# Altium footprint library TO Package-Transistor Outline.PcbLib: 31 footprints (part 1 of 2)
Each footprint in its own frame and in the unit in brackets; x right, y up, seen from the top. Pads: shape width x height; smd on the part's side, far side on the other; paste and mask are expansions set on the pad; w line width, h text height; cw(c..) or ccw(c..) is an arc to the next point about the centre after c.
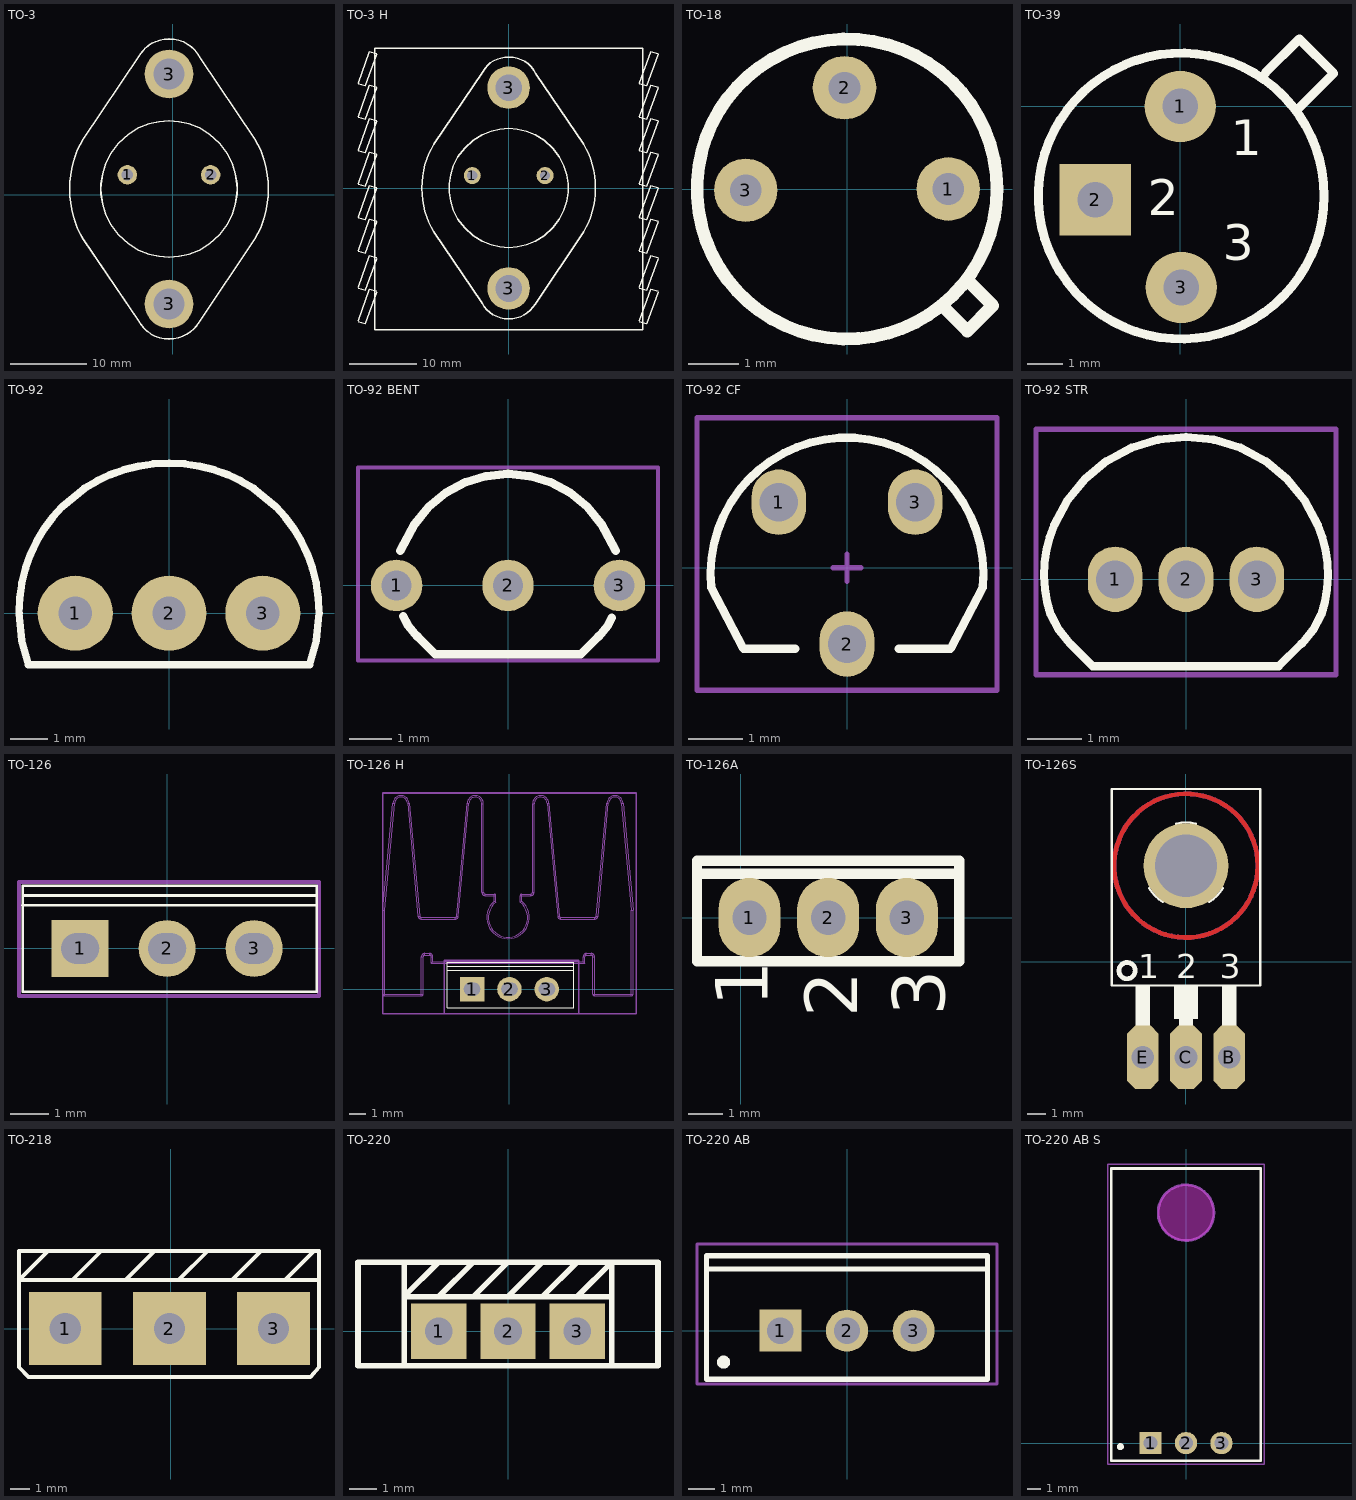
[diagram p0: the footprints below, top view; thin cyan lines are the x and y axes]

## TO-3 [mil]
height 10
pads (4):
  round 100 hole 60: 1(-234,103) 2(194,103)
  round 250 hole 157.4: 3(-20,-560) 3(-20,620)
Top Overlay:
  lines w8: -530,30 -528.8,-5.7 -525.4,-40.5 -519.7,-74.6 -511.9,-107.6 -501.9,-139.6 -489.9,-170.4 -475.9,-199.9 -460,-228 -175,-647 -162.8,-667.1 -148.1,-685.2 -131.1,-701 -112.1,-714.5 -91.3,-725.3 -68.8,-733.3 -45,-738.3 -20,-740 4.6,-738.4 28.1,-733.7 50.3,-726.2 71,-716 90,-703.4 107.1,-688.5 122.2,-671.7 135,-653 420,-227 435.9,-199.2 449.9,-170 461.9,-139.4 471.9,-107.5 479.7,-74.5 485.4,-40.5 488.8,-5.7 490,30 488.8,65.7 485.4,100.5 479.7,134.5 471.9,167.5 461.9,199.4 449.9,230 435.9,259.2 420,287 140,702 127.1,723.7 111.8,743 94.2,759.8 74.6,773.9 53.2,785.1 30.2,793.3 5.7,798.3 -20,800 -43.9,798.5 -66.8,794.1 -88.4,786.9 -108.5,777.2 -126.9,765.2 -143.5,751.1 -157.9,734.9 -170,717 -460,287 -475.9,259.2 -489.9,230 -501.9,199.4 -511.9,167.5 -519.7,134.5 -525.4,100.5 -528.8,65.7 -530,30 ; -370,30 -369,56 -361.2,108.2 -344.8,160.4 -318.6,212.6 -279.6,264.8 -228,311.5 -175.8,343.4 -123.6,364.3 -71.4,376.2 -20,380 31.4,376.2 83.6,364.3 135.8,343.4 188,311.5 239.6,264.8 278.6,212.6 304.8,160.4 321.2,108.2 329,56 330,30 329,4 321.2,-48.2 304.8,-100.4 278.6,-152.6 239.6,-204.8 188,-251.5 135.8,-283.4 83.6,-304.3 31.4,-316.2 -20,-320 -71.4,-316.2 -123.6,-304.3 -175.8,-283.4 -228,-251.5 -279.6,-204.8 -318.6,-152.6 -344.8,-100.4 -361.2,-48.2 -369,4 -370,30
3D body "User Library-TO-3_Long.STEP": height 413.39, standoff -393.7, extent -535.56,-751.77 495.08,806.89

## TO-3 H [mil]
height 10
pads (4):
  round 100 hole 60: 1(-214,73) 2(214,73)
  round 250 hole 157.4: 3(0,-590) 3(0,590)
Top Overlay:
  drawing of 176 lines, arcs and shapes, not listed
3D body "User Library-TO-3_Long.STEP": height 413.39, standoff -393.7, extent -512.64,-778.33 518,780.33
3D body "SW3dPS-Heat Sink.STEP": height 1246.06, standoff 39.37, extent -746.06,-841.77 750,811.77

## TO-18 [mm] "Transistor NPN"
height 20
pads (3):
  round 1.27 hole 0.635: 1(2.025,0) 2(-0.05,2.025) 3(-2.025,-0.025)
Top Overlay:
  circle w0.254: c0,0 r3
  lines w0.254: 1.899,-2.332 2.407,-2.84 2.915,-2.332 2.407,-1.824

## TO-39 [mm] "NPN Transistor"
pads (3):
  round 2 hole 1: 1(0,0) 3(0.025,-5.08)
  rect 2x2 hole 1: 2(-2.388,-2.616)
Top Overlay:
  circle w0.254: c0.026,-2.515 r4.012
  lines w0.254: 2.388,0.94 3.34,1.892 4.305,0.927 3.251,-0.127
  text "3" at 1.194,-4.318 h1
  text "2" at -0.914,-3.048 h1
  text "1" at 1.422,-1.372 h1
3D body "User Library-TO-18_2N2222.step": height 6.6, standoff -1.79, extent -2.794,-5.303 2.814,0.305

## TO-92 [mil]
pads (3):
  round 80 hole 35.43: 1(-100,0) 2(0,0) 3(100,0)
Top Overlay:
  lines w8: -160,0 -157.2,-29 -150,-55 150,-55 157.2,-29 160,0 159.2,16.6 156.8,32.7 153,48.2 147.7,63 141,77 133.1,90.2 124,102.5 113.8,113.8 90.2,133.1 77,141 63,147.7 48.2,152.9 32.7,156.8 16.6,159.2 0,160 -16.6,159.2 -32.7,156.8 -48.2,152.9 -63,147.7 -77,141 -90.2,133.1 -113.8,113.8 -124,102.5 -133.1,90.2 -141,77 -147.7,63 -153,48.2 -156.8,32.7 -159.2,16.6 -160,0
3D body "SW3dPS-TO92.STEP": height 141.68, standoff -303.15, extent -108.87,-62.13 108.87,98.42

## TO-92 BENT [mm] "DESIGNER :ABBAS BASEREH"
height 8
pads (3):
  round 1.2 hole 0.7: 1(-2.6,0) 2(0,0) 3(2.6,0)
Top Overlay:
  lines w0.2: -2.512,0.806 -2.173,1.441 -1.848,1.837 -1.452,2.162 -1,2.403 -0.51,2.552 0,2.602 0.51,2.552 1,2.403 1.452,2.162 1.848,1.837 2.173,1.441 2.512,0.806 ; -2.443,-0.723 -2.326,-0.941 -2.118,-1.195 -2.112,-1.189 -1.7,-1.601 1.7,-1.601 2.112,-1.189 2.118,-1.195 2.326,-0.941 2.424,-0.759
Mechanical 15:
  lines w0.1: -3.5,-1.75 -3.5,2.75 3.5,2.75 3.5,-1.75 -3.5,-1.75
3D body "User Library-TO-92_Bent.STEP": height 10, standoff -3, extent -2.79,-1.59 2.79,2.613

## TO-92 CF [mm] "DESIGNER :ABBAS BASEREH"
height 8.5
pads (3):
  oval 1x1.2 hole 0.7: 1(-1.25,1.2) 2(0,-1.4) 3(1.25,1.2)
Top Overlay:
  lines w0.15: -0.95,-1.485 -1.9,-1.485 -2.487,-0.365 cw(c0,-0.115) 2.487,-0.365 1.9,-1.485 0.95,-1.485
Mechanical 15:
  lines w0.1: -0.25,0 0.25,0 ; 0,-0.25 0,0.25 ; -2.75,-2.25 2.75,-2.25 2.75,2.75 -2.75,2.75 -2.75,-2.25
3D body "User Library-TO-92_CF127SB127.STEP": height 8.5, standoff -4, extent -2.5,-1.57 2.5,2.4

## TO-92 STR [mm] "DESIGNER :ABBAS BASEREH"
height 7
pads (3):
  oval 1x1.2 hole 0.7 mask+0.06: 1(-1.3,0) 2(0,0) 3(1.3,0)
Top Overlay:
  lines w0.15: -2.481,-0.642 cw(c-0.325,0.092) -2.414,0.999 -2.173,1.45 -1.848,1.846 -1.452,2.171 -1,2.413 -0.51,2.562 0,2.612 0.51,2.562 1,2.413 1.452,2.171 1.848,1.846 2.173,1.45 2.414,0.999 cw(c0.325,0.092) 2.481,-0.642 2.326,-0.931 2.118,-1.185 2.112,-1.18 1.7,-1.592 -1.712,-1.592 -2.118,-1.185 -2.326,-0.931 -2.481,-0.642
Mechanical 15:
  lines w0.1: -2.75,-1.75 -2.75,2.75 2.75,2.75 2.75,-1.75 -2.75,-1.75
3D body "User Library-TO-92_Str.STEP": height 10, standoff -3, extent -2.613,-1.591 2.613,2.613

## TO-126 [mm] "Design:Abbas Basereh"
height 16
pads (3):
  rect 1.5x1.5 hole 0.8 slot 1 at 0 deg: 1(-2.29,0)
  round 1.5 hole 0.8 slot 1 at 0 deg: 2(0,0) 3(2.29,0)
Top Overlay:
  lines w0.07: -3.81,1.143 3.937,1.143 3.937,1.651 ; -3.8,1.397 3.937,1.397 ; 3.937,1.651 3.937,-1.143 -3.8,-1.143 -3.8,1.651 3.937,1.651
Mechanical 15:
  lines w0.1: -3.9,-1.25 4,-1.25 4,1.75 -3.9,1.75 -3.9,-1.25
3D body "User Library-TO-126 (SOT32) Gold PCB.STEP": height 13.19, standoff -3.54, extent -3.8,-1 3.8,1.55

## TO-126 H [mm] "Design:Abbas Basereh"
height 16
pads (3):
  rect 1.5x1.5 hole 0.8 slot 1 at 0 deg: 1(-2.29,0)
  round 1.5 hole 0.8 slot 1 at 0 deg: 2(0,0) 3(2.29,0)
Top Overlay:
  lines w0.07: -3.81,1.143 3.937,1.143 3.937,1.651 ; -3.8,1.397 3.937,1.397 ; 3.937,1.651 3.937,-1.143 -3.8,-1.143 -3.8,1.651 3.937,1.651
Mechanical 1:
  lines w0.013: -7.74,-0.318 ccw(c-7.64,-0.318) -7.64,-0.418 ; -5.498,4.473 ccw(c-5.399,4.482) -5.399,4.382 ; -5.39,-0.418 ccw(c-5.39,-0.318) -5.29,-0.318 ; -5.29,1.982 cw(c-5.19,1.982) -5.19,2.082 ; -4.89,2.082 cw(c-4.89,1.982) -4.79,1.982 ; -3.327,4.382 ccw(c-3.327,4.482) -3.227,4.473 ; -1.59,5.919 ccw(c-1.49,5.919) -1.49,5.819 ; -0.94,5.819 cw(c-0.94,5.719) -0.84,5.719 ; 0.66,5.719 cw(c0.76,5.719) 0.76,5.819 ; 1.31,5.819 ccw(c1.31,5.919) 1.41,5.919 ; 3.047,4.473 ccw(c3.147,4.482) 3.147,4.382 ; 4.61,1.982 cw(c4.71,1.982) 4.71,2.082 ; 5.01,2.082 cw(c5.01,1.982) 5.11,1.982 ; 5.11,-0.318 ccw(c5.21,-0.318) 5.21,-0.418 ; 5.219,4.382 ccw(c5.219,4.482) 5.318,4.473 ; 7.46,-0.418 ccw(c7.46,-0.318) 7.56,-0.318
  lines w0.05: -7.74,4.832 -7.133,11.388 ; -7.74,4.832 -7.64,4.827 ; -7.74,4.832 -7.74,-0.318 -7.64,-0.318 ; -7.64,-0.318 -7.64,-0.418 -5.39,-0.418 -5.39,-0.318 ; -7.64,-0.318 -7.64,4.827 ; -7.64,-0.318 -5.39,-0.318 ; -7.64,4.827 -7.034,11.379 ; -7.133,11.388 cw(c-6.636,11.342) -6.138,11.388 ; -7.133,11.388 -7.034,11.379 ; -7.034,11.379 cw(c-6.636,11.342) -6.237,11.379 ; -6.237,11.379 -6.138,11.388 ; -6.237,11.379 -5.598,4.464 ; -6.138,11.388 -5.498,4.473 -5.598,4.464 ; -5.598,4.464 ccw(c-5.399,4.482) -5.399,4.282 ; -5.399,4.282 -5.399,4.382 -3.327,4.382 -3.327,4.282 ; -5.399,4.282 -3.327,4.282 ; -5.39,-0.318 -5.29,-0.318 -5.29,1.982 -5.39,1.982 ; -5.39,-0.318 -5.39,1.982 ; -5.39,1.982 cw(c-5.19,1.982) -5.19,2.182 ; -5.19,2.182 -5.19,2.082 -4.89,2.082 -4.89,2.182 ; -5.19,2.182 -4.89,2.182 ; -4.89,2.182 cw(c-4.89,1.982) -4.69,1.982 ; -4.79,1.582 -4.79,1.982 -4.69,1.982 ; -4.79,1.582 -4.69,1.682 ; -4.79,1.582 4.61,1.582 ; -4.69,1.682 -4.69,1.982 ; -4.69,1.682 4.51,1.682 ; -3.327,4.282 ccw(c-3.327,4.482) -3.128,4.464 ; -3.128,4.464 -3.227,4.473 -2.588,11.388 ; -3.128,4.464 -2.488,11.379 ; -2.588,11.388 cw(c-2.09,11.342) -1.59,11.342 ; -2.588,11.388 -2.488,11.379 ; -2.488,11.379 cw(c-2.09,11.342) -1.69,11.342 ; -1.69,5.919 ccw(c-1.49,5.919) -1.49,5.719 ; -1.69,5.919 -1.59,5.919 -1.59,11.342 ; -1.69,5.919 -1.69,11.342 ; -1.69,11.342 -1.59,11.342 ; -1.49,5.719 -1.49,5.819 -0.94,5.819 -0.94,5.719 ; -1.49,5.719 -0.94,5.719 ; -0.94,5.366 ccw(c-0.09,4.382) 0.76,5.366 ; -0.94,5.366 cw(c-3.387,0.015) -0.84,5.319 ; -0.94,5.366 -0.94,5.719 ; -0.94,5.719 -0.84,5.719 -0.84,5.319 ; -0.84,5.319 ccw(c-0.09,4.382) 0.66,5.319 ; 0.66,5.319 cw(c3.206,0.015) 0.76,5.366 ; 0.66,5.319 0.66,5.719 0.76,5.719 ; 0.76,5.366 0.76,5.719 ; 0.76,5.719 0.76,5.819 1.31,5.819 1.31,5.719 ; 0.76,5.719 1.31,5.719 ; 1.31,5.719 ccw(c1.31,5.919) 1.51,5.919 ; 1.41,11.342 cw(c1.91,11.342) 2.408,11.388 ; 1.41,11.342 1.51,11.342 ; 1.41,11.342 1.41,5.919 1.51,5.919 ; 1.51,5.919 1.51,11.342 ; 1.51,11.342 cw(c1.91,11.342) 2.308,11.379 ; 2.308,11.379 2.408,11.388 ; 2.308,11.379 2.947,4.464 ; 2.408,11.388 3.047,4.473 2.947,4.464 ; 2.947,4.464 ccw(c3.147,4.482) 3.147,4.282 ; 3.147,4.282 3.147,4.382 5.219,4.382 5.219,4.282 ; 3.147,4.282 5.219,4.282 ; 4.51,1.682 4.51,1.982 ; 4.51,1.682 4.61,1.582 ; 4.51,1.982 cw(c4.71,1.982) 4.71,2.182 ; 4.51,1.982 4.61,1.982 4.61,1.582 ; 4.71,2.182 4.71,2.082 5.01,2.082 5.01,2.182 ; 4.71,2.182 5.01,2.182 ; 5.01,2.182 cw(c5.01,1.982) 5.21,1.982 ; 5.21,-0.318 5.11,-0.318 5.11,1.982 5.21,1.982 ; 5.21,-0.318 5.21,-0.418 7.46,-0.418 7.46,-0.318 ; 5.21,-0.318 5.21,1.982 ; 5.21,-0.318 7.46,-0.318 ; 5.219,4.282 ccw(c5.219,4.482) 5.418,4.464 ; 5.418,4.464 5.318,4.473 5.958,11.388 ; 5.418,4.464 6.057,11.379 ; 5.958,11.388 cw(c6.455,11.342) 6.953,11.388 ; 5.958,11.388 6.057,11.379 ; 6.057,11.379 cw(c6.455,11.342) 6.854,11.379 ; 6.854,11.379 6.953,11.388 ; 6.854,11.379 7.46,4.827 ; 6.953,11.388 7.56,4.832 ; 7.46,-0.318 7.46,4.827 ; 7.46,-0.318 7.56,-0.318 7.56,4.832 ; 7.46,4.827 7.56,4.832
Mechanical 15:
  lines w0.1: -4,-1.5 -4,1.75 4.25,1.75 4.25,-1.5 ; -7.75,-1.5 7.75,-1.5 7.75,12 -7.75,12 -7.75,-1.5
3D body "User Library-Heatsink-57AS.STEP": height 26.5, standoff 1.5, extent -7.68,-0.381 7.62,11.878
3D body "User Library-TO-126 (SOT32) Gold PCB.STEP": height 13.19, standoff -3.54, extent -3.8,-1 3.8,1.55

## TO-126A [mm]
pads (3):
  oval 1.8x2.3 hole 1: 1(0.254,0) 2(2.54,0) 3(4.826,0)
Top Overlay:
  lines w0.3: -1.27,1.27 -1.27,1.651 6.35,1.651 6.35,1.27
  lines w0.305: -1.27,-1.27 -1.27,1.27 6.35,1.27 6.35,-1.27 -1.27,-1.27
  text "2" at 3.378,-2.896 h1.52
  text "3" at 5.918,-2.845 h1.52
  text "1" at 0.787,-2.591 h1.52
3D body "User Library-BD135 (TO-126,SOT32) v4.STEP": height 15.6, standoff -2.35, extent -1.36,-1.811 6.44,0.889

## TO-126S [mm]
pads (4):
  oct 1.676x3.353 hole 1.2: B(2.291,-5.076) C(0.005,-5.076) E(-2.281,-5.076)
  round 4.5 hole 3.3 unplated: ""(0.005,5.084)
Top Layer:
  circle w0.254: c0.005,5.084 r3.81
Bottom Layer:
  circle w0.254: c0.005,5.084 r3.81
Top Overlay:
  circle w0.127: c0.005,5.084 r1.651
  circle w0.254: c-3.119,-0.479 r0.432
  rectangle: 1.91,-5.203 2.672,-3.425
  rectangle: 1.91,-3.425 2.672,-1.266
  rectangle: -0.376,-5.203 0.386,-3.425
  rectangle: -0.376,-3.425 0.386,-1.266
  rectangle: -2.662,-5.203 -1.9,-3.425
  rectangle: -2.662,-3.425 -1.9,-1.266
  rectangle: -0.63,-3.044 0.64,-1.266
  lines w0.127: -1.474,4.349 -1.944,3.89 ccw(c0.005,5.084) -1.234,3.163 -0.764,3.623 ; -0.503,6.655 -0.503,7.313 cw(c0.005,5.084) 0.513,7.313 0.513,6.655 ; 0.774,3.623 1.244,3.163 ccw(c0.005,5.084) 1.954,3.889 1.484,4.349 ; -3.932,-1.266 3.942,-1.266 3.942,9.148 -3.932,9.148 -3.932,-1.266
  text "3" at 1.783,-0.885 h1.27
  text "2" at -0.503,-0.885 h1.27
  text "1" at -2.535,-0.885 h1.27

## TO-218 [mil]
pads (3):
  rect 150x150 hole 65: 1(-217.8,0.97) 2(-2.8,0.97) 3(212.2,0.97)
Top Overlay:
  lines w8: -293.8,-99.03 -313.8,-79.03 -313.8,100.97 ; -292.8,-99.03 287.2,-99.03 ; -253.8,160.97 -313.8,100.97 ; -203.8,100.97 -143.8,160.97 ; -93.8,100.97 -33.8,160.97 ; 16.2,100.97 76.2,160.97 ; 126.2,100.97 186.2,160.97 ; 288.2,-99.03 306.2,-79.03 306.2,100.97 ; -313.8,100.97 -313.8,160.97 306.2,160.97 306.2,100.97 ; -313.8,100.97 306.2,100.97 ; 236.2,100.97 296.2,160.97 236.2,100.97
3D body "User Library-TOP3.STEP": height 1019.68, standoff -393.7, extent -309.05,-56.1 301.18,121.06

## TO-220 [mil]
pads (3):
  rect 80x80 hole 40: 1(-100,0) 2(0,0) 3(100,0)
Top Overlay:
  lines w7.99: -150,-50 -216.54,-50 -216.54,100 -150,100 ; 150,-50 216.54,-50 216.54,100 150,100
  lines w8: -100,50 -50,100 ; -100,100 -150,50 ; -50,50 0,100 ; 0,50 50,100 ; 50,50 100,100 ; 100,50 150,100 ; -150,50 -150,100 150,100 ; -150,50 -150,-50 150,-50 150,50 ; -150,50 150,50 ; 150,50 150,100
3D body "SW3dPS-TO220AB.STEP": height 957.87, standoff -196.85, extent -220.73,-57.09 220.73,127.56

## TO-220 AB [mm] "Epoxy meets UL94, V0-Design:Abbas Basereh"
height 17
pads (3):
  rect 1.6x1.6 hole 1: 1(-2.54,0)
  round 1.6 hole 1: 2(0,0) 3(2.54,0)
Top Overlay:
  circle w0.25: c-4.7,-1.2 r0.125
  lines w0.2: -5.35,2.35 5.35,2.35 ; -5.35,-1.85 5.35,-1.85 5.35,2.85 -5.35,2.85 -5.35,-1.85
Mechanical 13:
  lines w0.1: -5.35,-1.85 -5.35,2.85 5.35,2.85 5.35,-1.85 -5.35,-1.85
Mechanical 15:
  lines w0.1: -0.5,0 0.5,0 ; 0,-0.5 0,0.5 ; -5.715,-2.032 -5.715,3.302 5.715,3.302 5.715,-2.032 -5.715,-2.032
3D body "SW3dPS-TO220AB.STEP": height 24.33, standoff -5, extent -5.607,-1.45 5.607,3.24

## TO-220 AB S [mm] "Epoxy meets UL94, V0-Design:Abbas Basereh"
height 17
pads (3):
  rect 1.6x1.6 hole 1: 1(-2.54,0)
  round 1.6 hole 1: 2(0,0) 3(2.54,0)
Top Overlay:
  circle w0.25: c-4.699,-0.254 r0.125
  lines w0.2: -5.35,-1.27 -5.35,19.685 5.35,19.685 5.35,-1.27 -5.35,-1.27
Keep-Out Layer:
  board cut-out: -2,16.5 -2,16.697 -1.923,17.083 -1.772,17.447 -1.553,17.775 -1.275,18.053 -0.947,18.272 -0.583,18.423 -0.197,18.5 0.197,18.5 0.583,18.423 0.947,18.272 1.275,18.053 1.553,17.775 1.772,17.447 1.923,17.083 2,16.697 2,16.5 1.999,16.303 1.922,15.917 1.771,15.554 1.552,15.226 1.274,14.948 0.946,14.729 0.583,14.578 0.197,14.5 0,14.5 -0.197,14.5 -0.583,14.577 -0.947,14.728 -1.275,14.947 -1.554,15.225 -1.772,15.553 -1.923,15.917 -2,16.303
Mechanical 1:
  circle w0.2: c0,16.51 r2
Mechanical 13:
  lines w0.1: -5.35,-1.27 5.35,-1.27 5.35,19.685 -5.35,19.685 -5.35,-1.27
Mechanical 15:
  lines w0.1: -0.5,0 0.5,0 ; 0,-0.5 0,0.5 ; -5.6,-1.5 -5.6,20 5.6,20 5.6,-1.5 -5.6,-1.5
3D body "SW3DPS-TO-220-DEFAULT.STEP": height 4.2, standoff -3, extent -5.08,0 5.08,19.49